# Altium footprint library AltiumLibrary.PcbLib: 87 footprints (part 4 of 6)
Each footprint in its own frame and in the unit in brackets; x right, y up, seen from the top. Pads: shape width x height; smd on the part's side, far side on the other; paste and mask are expansions set on the pad; w line width, h text height; cw(c..) or ccw(c..) is an arc to the next point about the centre after c.
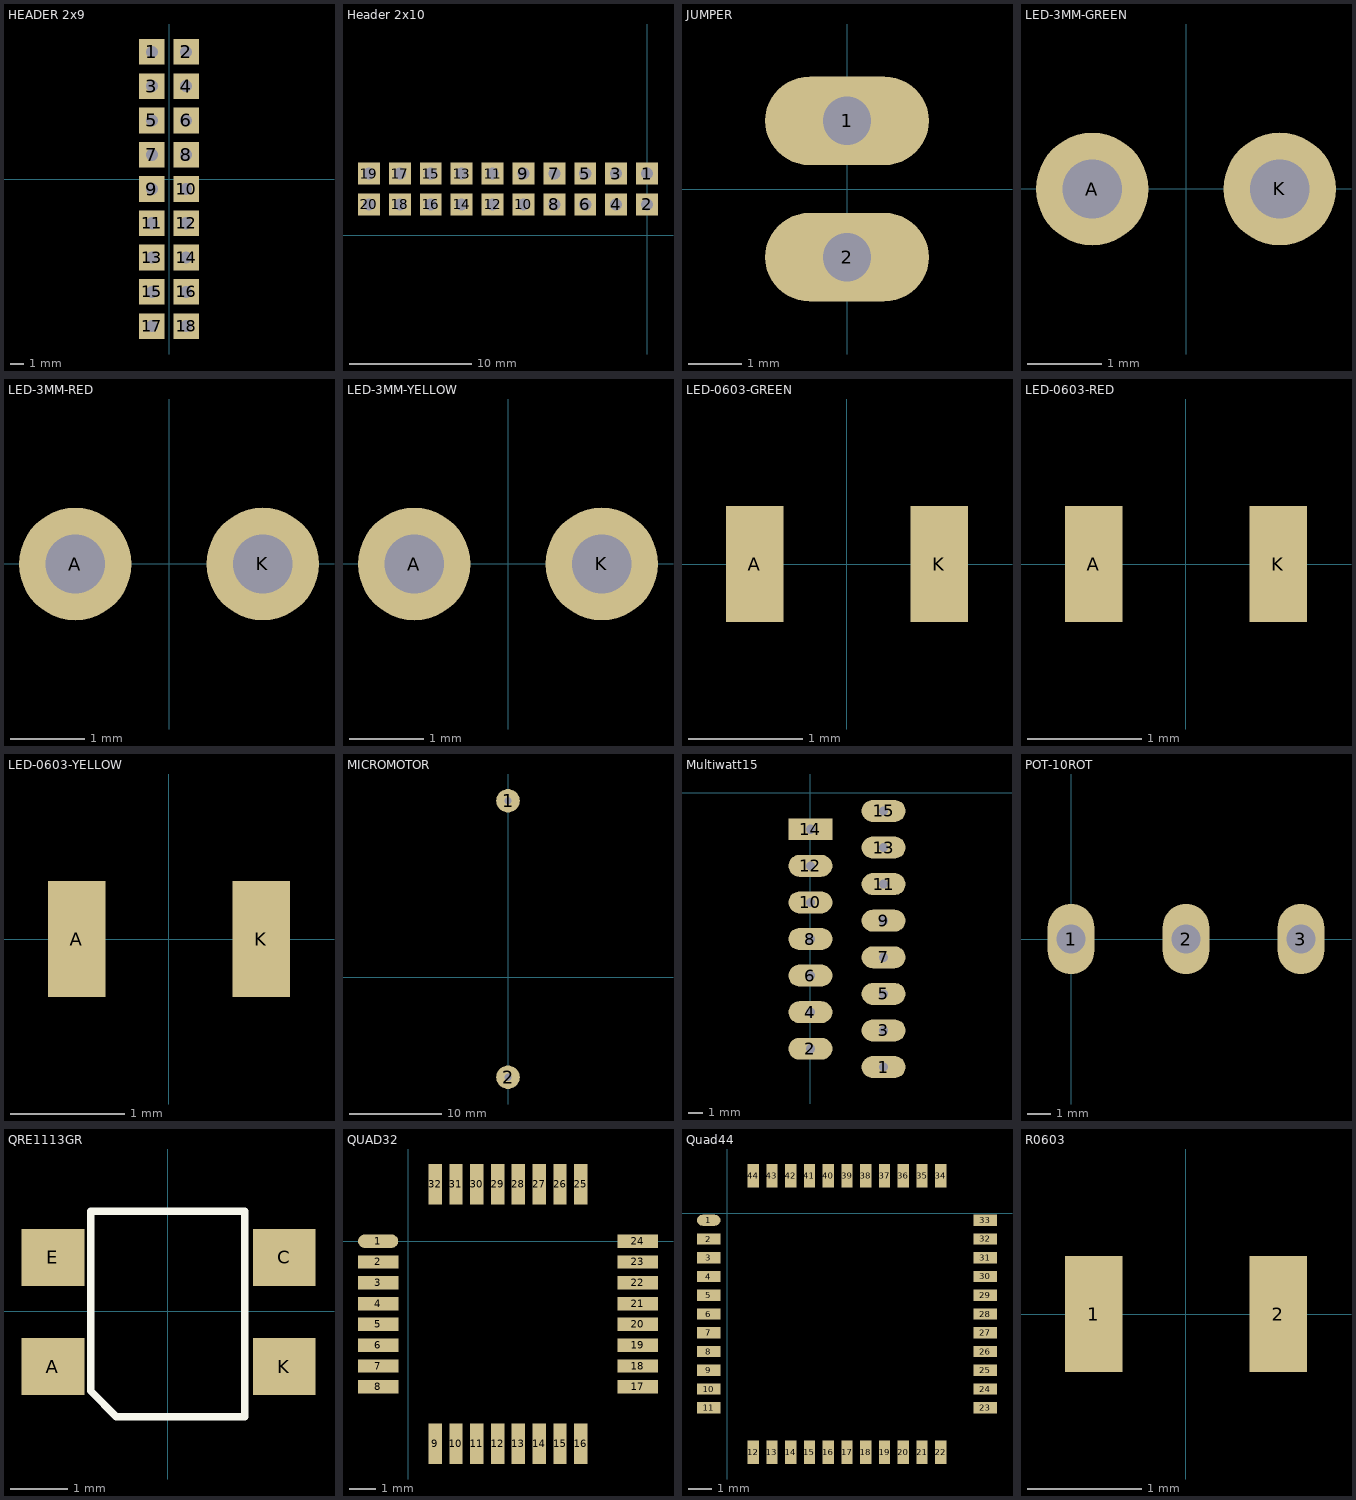
[diagram p3: the footprints below, top view; thin cyan lines are the x and y axes]

## HEADER 2x9 [mil]
pads (18):
  rect 75x75 hole 35.43: 1(-50,372) 2(50,372) 3(-50,272) 4(50,272) 5(-50,172) 6(50,172) 7(-50,72) 8(50,72) 9(-50,-28) 10(50,-28) 11(-50,-128) 12(50,-128) 13(-50,-228) 14(50,-228) 15(-50,-328) 16(50,-328) 17(-50,-428) 18(50,-428)
3D body "User Library-Header_Male_5Pin.STEP": height 336.22, standoff -118.11, extent -99.01,-477.99 -0.99,22.01
3D body "User Library-Header_Male_5Pin.STEP": height 336.22, standoff -118.11, extent 0.99,-477.99 99.01,22.01
3D body "User Library-Header_Male_4Pin.STEP": height 336.22, standoff -118.11, extent -99.01,22 -0.98,422
3D body "User Library-Header_Male_4Pin.STEP": height 336.22, standoff -118.11, extent 0.99,22.01 99.01,422.01

## Header 2x10 [mm]
pads (20):
  rect 1.8x1.8 hole 1: 1(0,5.08) 2(0,2.54) 3(-2.54,5.08) 4(-2.54,2.54) 5(-5.08,5.08) 6(-5.08,2.54) 7(-7.62,5.08) 8(-7.62,2.54) 9(-10.16,5.08) 10(-10.16,2.54) 11(-12.7,5.08) 12(-12.7,2.54) 13(-15.24,5.08) 14(-15.24,2.54) 15(-17.78,5.08) 16(-17.78,2.54) 17(-20.32,5.08) 18(-20.32,2.54) 19(-22.86,5.08) 20(-22.86,2.54)
3D body "DS1021-2x5S61.stp": height 8.6, standoff -3, extent -24.13,1.27 -11.43,6.35
3D body "DS1021-2x5S61.stp": height 8.6, standoff -3, extent -11.43,1.27 1.27,6.35

## JUMPER [mil]
pads (2):
  oval 120x65 hole 35.43: 1(0,50) 2(0,-50)
3D body "User Library-Header_Male_2Pin.STEP": height 336.22, standoff -118.11, extent -49.01,-99.99 49.01,100.01
3D body "Pin header jumper.stp": height 350, standoff 113.78, extent -49.01,-96.84 49.41,100.01

## LED-3MM-GREEN [mil]
pads (2):
  round 60 hole 31.5: A(-50,0) K(50,0)
3D body "SW3dPS-LEDd3G.STEP": height 217.04, standoff -97.93, extent -65.51,-65.13 64.41,64.79

## LED-3MM-RED [mil]
pads (2):
  round 60 hole 31.5: A(-50,0) K(50,0)
3D body "SW3dPS-LEDd3R.STEP": height 217.04, standoff -97.93, extent -65.51,-65.13 64.41,64.8

## LED-3MM-YELLOW [mil]
pads (2):
  round 60 hole 31.5: A(-50,0) K(50,0)
3D body "SW3dPS-LEDd3Y.STEP": height 217.04, standoff -97.93, extent -65.51,-65.13 64.41,64.8

## LED-0603-GREEN [mil]
pads (2):
  rect 20x40 smd: A(-31.89,0) K(31.89,0)
3D body "User Library-led0603_GRE.step": height 43.31, standoff 0, extent -31.89,-15.74 31.89,15.75

## LED-0603-RED [mil]
pads (2):
  rect 20x40 smd: A(-31.89,0) K(31.89,0)
3D body "User Library-led0603_RED.step": height 43.31, standoff 0, extent -31.89,-15.74 31.89,15.75

## LED-0603-YELLOW [mil]
pads (2):
  rect 20x40 smd: A(-31.89,0) K(31.89,0)
3D body "User Library-led0603_YEL.step": height 43.31, standoff 0, extent -31.89,-15.74 31.89,15.75

## MICROMOTOR [mm]
pads (2):
  round 2.54 hole 0.8: 1(0,19.05) 2(0,-10.795)
3D body "User Library-MOTOR, POLOLU.step": height 9.95, standoff -0.05, extent -0.762,-2.094 34.008,9.906
3D body "User Library-Pololu Extended Micro Metal Bracket.step": height 11.5, standoff 0, extent 7.366,-9.525 24.666,17.075

## Multiwatt15 [mil]
pads (15):
  oval 120x60 hole 25: 1(200,-750) 2(0,-700) 3(200,-650) 4(0,-600) 5(200,-550) 6(0,-500) 7(200,-450) 8(0,-400) 9(200,-350) 10(0,-300) 11(200,-250) 12(0,-200) 13(200,-150) 15(200,-50)
  rect 120x60 hole 25: 14(0,-100)
3D body "User Library-Multiwatt15V.STEP": height 831.1, standoff -46.85, extent -175,-785.83 214.37,-14.17

## POT-10ROT [mil]
pads (3):
  oval 80x120 hole 49.21: 1(0,0) 2(196.85,0) 3(393.7,0)
3D body "B10K potentiometer 10K.stp": height 828.74, standoff -137.8, extent -137.59,-780.71 535.6,203.54

## QRE1113GR [mm]
pads (4):
  rect 1.1x1 smd: A(-2.01,-0.97) C(2.04,0.94) E(-2.01,0.94) K(2.04,-0.97)
Top Overlay:
  lines w0.127: -1.35,-1.4 -1.35,1.75 1.35,1.75 1.35,-1.85 -0.9,-1.85 -1.35,-1.4
Top Paste:
  region: -2.601,1.5 -1.4,1.5 -1.4,0.4 -2.601,0.4
  region: -2.605,-0.4 -1.4,-0.4 -1.4,-1.503 -2.605,-1.503
  region: 1.453,-0.4 2.65,-0.4 2.65,-1.503 1.453,-1.503
  region: 1.404,1.5 2.65,1.5 2.65,0.401 1.404,0.401
3D body "User Library-QRE1113GR.step": height 1.83, standoff -0.02, extent -2.4,-1.8 2.4,1.8

## QUAD32 [mil]
pads (32):
  oval 60x20 smd: 1(-45,0)
  rect 60x20 smd: 2(-45,-31) 3(-45,-62) 4(-45,-93) 5(-45,-124) 6(-45,-155) 7(-45,-186) 8(-45,-217) 17(342,-217) 18(342,-186) 19(342,-155) 20(342,-124) 21(342,-93) 22(342,-62) 23(342,-31) 24(342,0)
  rect 20x60 smd: 9(40,-302) 10(71,-302) 11(102,-302) 12(133,-302) 13(164,-302) 14(195,-302) 15(226,-302) 16(257,-302) 25(257,85) 26(226,85) 27(195,85) 28(164,85) 29(133,85) 30(102,85) 31(71,85) 32(40,85)
3D body "User Library-PTQFPK32.step": height 68, standoff 5, extent -32,-289 328,71

## Quad44 [mm]
pads (44):
  oval 1x0.47 smd: 1(-0.8,-0.3)
  rect 1x0.47 smd: 2(-0.8,-1.1) 3(-0.8,-1.9) 4(-0.8,-2.7) 5(-0.8,-3.5) 6(-0.8,-4.3) 7(-0.8,-5.1) 8(-0.8,-5.9) 9(-0.8,-6.7) 10(-0.8,-7.5) 11(-0.8,-8.3) 23(11,-8.3) 24(11,-7.5) 25(11,-6.7) 26(11,-5.9) 27(11,-5.1) 28(11,-4.3) 29(11,-3.5) 30(11,-2.7) 31(11,-1.9) 32(11,-1.1) 33(11,-0.3)
  rect 0.47x1 smd: 12(1.1,-10.2) 13(1.9,-10.2) 14(2.7,-10.2) 15(3.5,-10.2) 16(4.3,-10.2) 17(5.1,-10.2) 18(5.9,-10.2) 19(6.7,-10.2) 20(7.5,-10.2) 21(8.3,-10.2) 22(9.1,-10.2) 34(9.1,1.6) 35(8.3,1.6) 36(7.5,1.6) 37(6.7,1.6) 38(5.9,1.6) 39(5.1,1.6) 40(4.3,1.6) 41(3.5,1.6) 42(2.7,1.6) 43(1.9,1.6) 44(1.1,1.6)
3D body "User Library-44 pin tqfp ic package.step": height 1.2, standoff 0.09, extent -0.9,-10.3 11.1,1.7

## R0603 [mil]
pads (2):
  rect 20x40 smd: 1(-31.89,0) 2(31.89,0)
3D body "User Library-0603 SMD Resistor.step": height 11.89, standoff 0, extent -31.49,-15.74 31.5,15.75